# Altium footprint library Connectors.PcbLib: 268 footprints (part 11 of 21)
Each footprint in its own frame and in the unit in brackets; x right, y up, seen from the top. Pads: shape width x height; smd on the part's side, far side on the other; paste and mask are expansions set on the pad; w line width, h text height; cw(c..) or ccw(c..) is an arc to the next point about the centre after c.
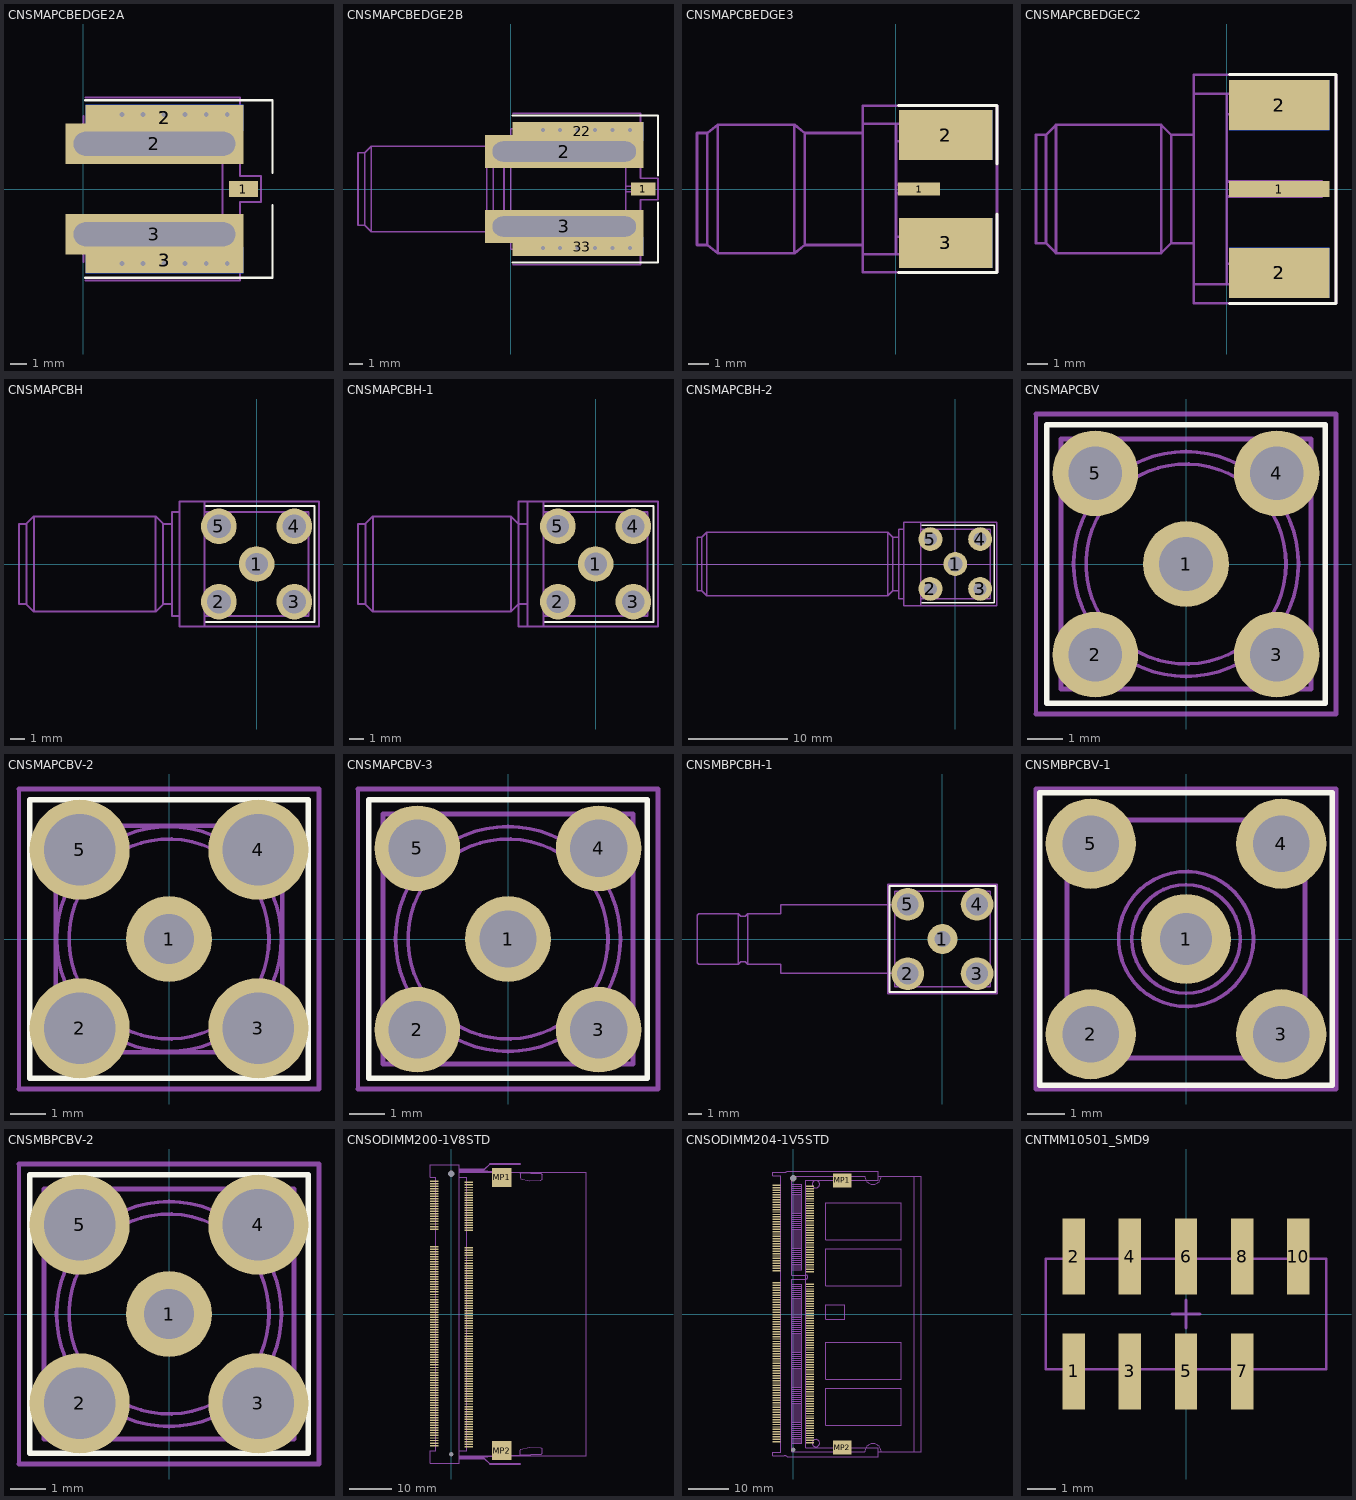
[diagram p10: the footprints below, top view; thin cyan lines are the x and y axes]

## CNSMAPCBEDGE2A [mm] "SMA PCB edge female 2 - pads only"
height 6
pads (7):
  rect 1.8x1 smd paste-3: 1(9.9,0)
  rect 11x2.5 hole 1.5 slot 10 at 0 deg mask+0.254: 2(4.4,2.8) 3(4.4,-2.8)
  rect 9.75x1.6 smd paste-3: 2(5.025,4.4) 3(5.025,-4.4)
  rect 9.75x1.6 smd far side paste-3: 2(5.025,4.4) 3(5.025,-4.4)
via 5,-4.6 diameter 0.65 hole 0.3
via 3.7,-4.6 diameter 0.65 hole 0.3
via 2.4,-4.6 diameter 0.65 hole 0.3
via 6.3,-4.6 diameter 0.65 hole 0.3
via 7.6,-4.6 diameter 0.65 hole 0.3
via 8.9,-4.6 diameter 0.65 hole 0.3
via 8.9,4.6 diameter 0.65 hole 0.3
via 7.6,4.6 diameter 0.65 hole 0.3
via 6.3,4.6 diameter 0.65 hole 0.3
via 2.4,4.6 diameter 0.65 hole 0.3
via 3.7,4.6 diameter 0.65 hole 0.3
via 5,4.6 diameter 0.65 hole 0.3
Top Overlay:
  lines w0.15: 0.131,-5.5 11.7,-5.5 11.7,-1 ; 0.131,5.5 11.7,5.5 11.7,1
Mechanical 15:
  lines w0.127: 0,-4.5 0,-2.8 8.6,-2.8 8.6,2.8 0,2.8 0,4.5 ; 0.15,-5.65 9.7,-5.65 9.7,-0.8 11,-0.8 11,0.8 9.7,0.8 9.7,5.65 0.15,5.65

## CNSMAPCBEDGE2B [mm] "SMA PCB edge female 2 reduced copper bot"
height 6
pads (7):
  rect 1.8x1 smd paste-5: 1(9.9,0)
  rect 11.8x2.5 hole 1.5 slot 10.7 at 0 deg mask+0.254: 2(4,2.8) 3(4,-2.8)
  rect 9.75x1.4 smd paste-10: 2(5.025,4.3) 3(5.025,-4.3)
  rect 8.5x1.4 smd far side paste-10: 2(5.65,4.3) 3(5.65,-4.3)
via 5,-4.4 diameter 0.65 hole 0.3
via 3.7,-4.4 diameter 0.65 hole 0.3
via 2.4,-4.4 diameter 0.65 hole 0.3
via 6.3,-4.4 diameter 0.65 hole 0.3
via 7.6,-4.4 diameter 0.65 hole 0.3
via 8.9,-4.4 diameter 0.65 hole 0.3
via 8.9,4.4 diameter 0.65 hole 0.3
via 7.6,4.4 diameter 0.65 hole 0.3
via 6.3,4.4 diameter 0.65 hole 0.3
via 2.4,4.4 diameter 0.65 hole 0.3
via 3.7,4.4 diameter 0.65 hole 0.3
via 5,4.4 diameter 0.65 hole 0.3
Top Overlay:
  lines w0.15: 0.131,-5.5 11,-5.5 11,-1 ; 0.131,5.5 11,5.5 11,1
Top Solder:
  rectangle: 0,1.5 8.6,5
  rectangle: 0,-5 8.6,-1.5
Bottom Solder:
  rectangle: 0,1.5 8.6,4.3
  rectangle: 0,-4.3 8.6,-1.5
Mechanical 13:
  lines w0.127: -1.8,-3.2 -10.4,-3.2 ; -1.8,3.2 -10.4,3.2 ; -1.3,-2.7 -0.5,-2.7 ; -1.3,2.7 -0.5,2.7 ; 0,-3.2 -0.5,-3.2 -0.5,3.2 0,3.2 ; 8.6,-0.203 10.6,-0.203 10.6,0.203 8.6,0.203 ; -10.9,-2.7 -11.4,-2.7 -11.4,2.7 -10.9,2.7 ; -10.9,-2.7 -10.4,-3.2 ; -10.9,-2.7 -10.9,2.7 ; -10.9,2.7 -10.4,3.2 ; -10.4,-3.2 -9.4,-3.2 ; -10.4,-3.2 -10.4,-3.1 -10.4,3.2 ; -9.4,-3.2 -9.4,-3.2 ; -1.794,3.2 -1.294,2.7 -1.294,-2.7 ; -1.794,3.2 -1.794,-3.2 -1.294,-2.7 ; -1.794,3.2 -1.794,3.2 ; -1.294,-2.7 -1.294,-2.7 ; 0,-3.5 0,-4.5 8.6,-4.5 8.6,-3.5 ; 0,-3.5 8.6,-3.5 ; 0,-3.5 0,3.5 ; 0,3.5 0,4.5 8.6,4.5 8.6,3.5 ; 0,3.5 8.6,3.5 ; 8.6,-3.5 8.6,3.5
Mechanical 15:
  lines w0.127: 0,-4.5 0,-2.8 8.6,-2.8 8.6,2.8 0,2.8 0,4.5 ; 0.15,-5.65 9.7,-5.65 9.7,-0.8 11,-0.8 11,0.8 9.7,0.8 9.7,5.65 0.15,5.65
  text "PCB MILLING LINE" at -4,1.7 h0.8
3D body "CN-SMAPCBHE1.stp": height 4.1, standoff -2.9, extent -11.4,-4.472 10.6,4.472

## CNSMAPCBEDGE3 [mm] "SMA PCB edge female EL-FS090-03"
height 6.3
pads (5):
  rect 2.032x0.61 smd: 1(1.118,0)
  rect 4.5x2.4 smd: 2(2.4,2.6) 3(2.4,-2.6)
  rect 4.5x2.4 smd far side: 2(2.4,2.6) 3(2.4,-2.6)
Top Overlay:
  lines w0.15: 0.131,-4.025 4.875,-4.025 4.875,-1.2 ; 0.131,4.025 4.875,4.025 4.875,1.2
Mechanical 13:
  lines w0.127: -1.6,-2.7 -4.4,-2.7 ; -1.6,2.7 -4.4,2.7 ; 0,-2.3 3.8,-2.3 3.8,-3.15 0,-3.15 ; 0,-0.203 1.854,-0.203 1.854,0.203 0,0.203 ; 0,2.3 3.8,2.3 3.8,3.15 0,3.15 ; -9.1,-2.7 -9.6,-2.7 -9.6,2.7 -9.1,2.7 ; -9.1,-2.7 -9.1,2.7 ; -9.1,-2.7 -8.6,-3.1 ; -9.1,2.7 -8.6,3.1 ; -8.6,-3.1 -4.9,-3.1 ; -8.6,-3.1 -8.6,3.1 ; -8.6,3.1 -4.9,3.1 ; -4.9,-3.1 -4.4,-2.7 ; -4.9,-3.1 -4.9,3.1 ; -4.9,3.1 -4.4,2.7 ; -4.4,-2.7 -4.4,-2.7 ; -4.4,-2.7 -4.4,2.7 ; 0,-3.15 0,3.15 ; 0,-3.15 -1.6,-3.15 -1.6,3.15 0,3.15
Mechanical 15:
  lines w0.127: -1.6,-4.025 4.875,-4.025 4.875,4.025 -1.6,4.025 -1.6,-4.025
3D body: height 0.77, standoff 0.02, extent 0,-0.374 2,0.374
3D body: height 1, standoff 0, extent 0,2.3 3.8,3.15
3D body: height -1.7, standoff -2.8, extent 0,2.3 3.8,3.15
3D body: height -1.7, standoff -2.8, extent 0,-3.15 3.8,-2.3
3D body: height 3.5, standoff -2.8, extent -1.6,-3.15 0,3.15
3D body: height 1, standoff 0, extent 0,-3.15 3.8,-2.3
3D body: height 3.08, standoff -2.3, extent -4.6,-2.695 -1.6,2.695
3D body: height 3.08, standoff -2.3, extent -9.6,-2.7 -8.7,2.689
3D body: height 3.48, standoff -2.7, extent -8.85,-3.094 -4.6,3.094

## CNSMAPCBEDGEC2 [mm] "SMA PCB edge female W9.54mm"
height 4.36
pads (5):
  rect 5x0.8 smd: 1(2.625,0)
  rect 5x2.5 smd: 2(2.625,-4.191) 2(2.625,4.191)
  rect 5x2.5 smd far side: 2(2.625,-4.191) 2(2.625,4.191)
Top Overlay:
  lines w0.15: 0.131,-5.715 5.461,-5.715 5.461,5.715 0.131,5.715
Mechanical 13:
  lines w0.127: -1.65,-2.7 -2.769,-2.7 ; -1.65,2.7 -2.769,2.7 ; 0,-3.734 4.75,-3.734 4.75,-4.75 0,-4.75 ; 0,-0.375 4.75,-0.375 4.75,0.375 0,0.375 ; 0,3.734 4.75,3.734 4.75,4.75 0,4.75 ; -9.025,-2.7 -9.525,-2.7 -9.525,2.7 -9.025,2.7 ; -9.025,-2.7 -8.525,-3.2 ; -9.025,-2.7 -9.025,2.7 ; -9.025,2.7 -8.525,3.2 ; -8.525,-3.2 -3.269,-3.2 ; -8.525,-3.2 -7.525,-3.2 ; -8.525,-3.2 -8.525,-3.1 -8.525,3.2 ; -8.525,3.2 -3.269,3.2 ; -7.525,-3.2 -7.525,-3.2 ; -3.269,-3.2 -2.769,-2.7 ; -3.269,-3.2 -3.269,3.2 ; -3.269,3.2 -2.769,2.7 ; -3.269,3.2 -3.269,3.2 ; -2.769,-2.7 -2.769,-2.7 ; -2.769,-2.7 -2.769,2.7 ; 0,-4.75 0,-3.5 0,3.5 0,4.75 ; 0,-4.75 -1.65,-4.75 -1.65,4.75 0,4.75
Mechanical 15:
  lines w0.127: -1.65,-5.715 5.461,-5.715 5.461,5.715 -1.65,5.715 -1.65,-5.715
3D body "732511150.stp": height 4.37, standoff -3.56, extent -9.53,-4.77 4.75,4.77

## CNSMAPCBH [mm]
height 10
pads (5):
  round 2.4 hole 1.5: 1(0,0)
  round 2.4 hole 1.6: 2(-2.54,-2.54) 3(2.54,-2.54) 4(2.54,2.54) 5(-2.54,2.54)
Top Overlay:
  lines w0.15: -3.4,-3.9 3.9,-3.9 3.9,3.9 -3.4,3.9
Mechanical 13:
  lines w0.127: -5.7,-2.7 -6.3,-2.7 ; -5.2,-3.5 -5.7,-3.5 -5.7,2.7 ; -5.2,3.5 -5.7,3.5 -5.7,2.7 ; -15.5,-2.7 -15.5,2.7 ; -15.5,-2.7 -15,-3.2 ; -15.5,-2.7 -16,-2.7 -16,2.7 -15.5,2.7 ; -15.5,2.7 -15,3.2 ; -15,-3.2 -15,-3.1 -15,3.2 ; -15,-3.2 -14,-3.2 ; -15,3.2 -6.8,3.2 ; -14,-3.2 -14,-3.2 ; -14,-3.2 -6.8,-3.2 ; -6.8,-3.2 -6.8,3.2 ; -6.8,-3.2 -6.3,-2.7 ; -6.8,3.2 -6.8,3.2 ; -6.8,3.2 -6.3,2.7 ; -6.3,-2.7 -6.3,2.7 ; -6.3,-2.7 -6.3,-2.7 ; -6.3,2.7 -5.7,2.7 ; -3.5,-3.5 -3.5,-4.2 -5.2,-4.2 -5.2,4.2 -3.5,4.2 -3.5,3.5 ; -3.5,-3.5 -3.5,3.5 ; -3.5,-3.5 3.5,-3.5 3.5,3.5 -3.5,3.5
Mechanical 15:
  lines w0.127: -5.2,-4.2 -5.2,4.2 4.2,4.2 4.2,-4.2 -5.2,-4.2

## CNSMAPCBH-1 [mm] "SMA connector PCB right angle for panel mount in THDW tech."
height 10.44
pads (5):
  round 2.4 hole 1.524: 1(0,0) 2(-2.54,-2.54) 3(2.54,-2.54) 4(2.54,2.54) 5(-2.54,2.54)
Top Overlay:
  lines w0.15: -3.4,-3.9 3.9,-3.9 3.9,3.9 -3.4,3.9
Mechanical 13:
  lines w0.127: -4.6,-2.7 -5.2,-2.7 ; -4.6,2.7 -5.2,2.7 ; -15.5,-2.7 -16,-2.7 -16,2.7 -15.5,2.7 ; -15.5,-2.7 -15,-3.2 ; -15.5,-2.7 -15.5,2.7 ; -15.5,2.7 -15,3.2 ; -15,-3.2 -14,-3.2 ; -15,-3.2 -15,-3.1 -15,3.2 ; -15,3.2 -5.7,3.2 ; -14,-3.2 -5.7,-3.2 ; -14,-3.2 -14,-3.2 ; -5.7,-3.2 -5.2,-2.7 ; -5.7,-3.2 -5.7,3.2 ; -5.7,3.2 -5.2,2.7 ; -5.7,3.2 -5.7,3.2 ; -5.2,-2.7 -5.2,-2.7 ; -5.2,-2.7 -5.2,2.7 ; -3.5,-3.5 -3.5,3.5 ; -3.5,-3.5 -3.5,-4.2 -4.6,-4.2 -4.6,4.2 -3.5,4.2 -3.5,3.5 ; -3.5,-3.5 3.5,-3.5 3.5,3.5 -3.5,3.5
Mechanical 15:
  lines w0.127: -5.2,-4.2 -5.2,4.2 4.2,4.2 4.2,-4.2 -5.2,-4.2
3D body: height 6.8, standoff 6, extent -16.053,-0.398 -15.553,0.399
3D body: height 8.6, standoff 4.2, extent -16.027,-2.191 -15.527,2.191
3D body: height 9.55, standoff 3.25, extent -15.2,-3.15 -5.5,3.15
3D body: height 9.08, standoff 3.7, extent -16,-2.695 -15.1,2.695
3D body: height 9.08, standoff 3.7, extent -5.5,-2.695 -4.6,2.695
3D body: height 10.65, standoff 2.15, extent -4.55,-4.249 -3.5,4.249
3D body: height 10.44, standoff 0, extent -3.5,-3.5 3.5,3.5

## CNSMAPCBH-2 [mm] "SMA connector PCB horizontal R5.0mm L=29.5mm"
height 10
pads (5):
  round 2.4 hole 1.5: 1(0,0)
  round 2.4 hole 1.3: 2(-2.5,-2.5) 3(2.5,-2.5) 4(2.5,2.5) 5(-2.5,2.5)
Top Overlay:
  lines w0.15: -3.4,-3.9 3.9,-3.9 3.9,3.9 -3.4,3.9
Mechanical 13:
  lines w0.127: -5.7,-2.7 -6.3,-2.7 ; -5.2,-3.5 -5.7,-3.5 -5.7,2.7 ; -5.2,3.5 -5.7,3.5 -5.7,2.7 ; -25.5,-2.7 -25.5,2.7 ; -25.5,-2.7 -25,-3.2 ; -25.5,-2.7 -26,-2.7 -26,2.7 -25.5,2.7 ; -25.5,2.7 -25,3.2 ; -25,-3.2 -25,-3.1 -25,3.2 ; -25,-3.2 -6.8,-3.2 ; -25,3.2 -6.8,3.2 ; -6.8,-3.2 -6.8,3.2 ; -6.8,-3.2 -6.3,-2.7 ; -6.8,3.2 -6.8,3.2 ; -6.8,3.2 -6.3,2.7 ; -6.3,-2.7 -6.3,2.7 ; -6.3,-2.7 -6.3,-2.7 ; -6.3,2.7 -5.7,2.7 ; -3.5,-3.5 -3.5,-4.2 -5.2,-4.2 -5.2,4.2 -3.5,4.2 -3.5,3.5 ; -3.5,-3.5 -3.5,3.5 ; -3.5,-3.5 3.5,-3.5 3.5,3.5 -3.5,3.5
Mechanical 15:
  lines w0.1: -26,-2.325 -26,1.975 ; -26,0 3.5,0 ; 0,-3.5 0,3.5
  lines w0.127: -5.2,-4.2 -5.2,4.2 4.2,4.2 4.2,-4.2 -5.2,-4.2
3D body: height 9.92, standoff 2.85, extent -5.7,-3.543 -5.2,3.543
3D body: height 10.62, standoff 2.15, extent -5.15,-4.242 -3.5,4.242
3D body: height 10, standoff 0, extent -3.4,-3.5 3.6,3.5
3D body: height 9.08, standoff 3.7, extent -6.6,-2.695 -5.7,2.695
3D body: height 9.08, standoff 3.7, extent -26,-2.695 -25.1,2.695
3D body: height 9.55, standoff 3.22, extent -25.1,-3.169 -6.6,3.169

## CNSMAPCBV [mm] "SMA connector PCB vertical R5.0mm"
height 10
pads (5):
  round 2.4 hole 1.5: 1(0,0) 2(-2.54,-2.54) 3(2.54,-2.54) 4(2.54,2.54) 5(-2.54,2.54)
Top Overlay:
  lines w0.15: -3.9,-3.9 3.9,-3.9 3.9,3.9 -3.9,3.9 -3.9,-3.9
Mechanical 13:
  circle w0.5: c0,0 r0.24
  circle w0.1: c0,0 r3.15
  circle w0.1: c0,0 r2.8
  lines w0.127: -3.5,-3.5 3.5,-3.5 3.5,3.5 -3.5,3.5 -3.5,-3.5
Mechanical 15:
  lines w0.1: -4.2,-4.2 -4.2,4.2
  lines w0.127: -4.2,-4.2 4.2,-4.2 4.2,4.2 -4.2,4.2
3D body "SMA-J-P-X-ST-TH1.step": height 9.57, standoff -3.94, extent -3.5,-3.5 3.5,3.501

## CNSMAPCBV-2 [mm] "SMA connector PCB vertical R5.0mm SMD PinInPaste"
height 7.6
pads (5):
  round 2.4 hole 1.4: 1(0,0)
  round 2.8 hole 2: 2(-2.5,-2.5) 3(2.5,-2.5) 4(2.5,2.5) 5(-2.5,2.5)
Top Overlay:
  lines w0.15: -3.9,-3.9 -3.9,3.9 3.9,3.9 3.9,-3.9 -3.9,-3.9
Mechanical 13:
  circle w0.1: c0,0 r2.8
  circle w0.1: c0,0 r3.15
  circle w0.5: c0,0 r0.24
  lines w0.127: -3.175,-3.175 -3.175,3.175 3.175,3.175 3.175,-3.175 -3.175,-3.175
Mechanical 15:
  lines w0.1: -4.2,-4.2 -4.2,4.2
  lines w0.127: -4.2,-4.2 4.2,-4.2 4.2,4.2 -4.2,4.2
3D body: height 1.03, standoff 0.1, extent -3.175,-3.175 3.175,3.175
3D body: height 1.03, standoff -1.27, extent -3.175,1.905 -1.905,3.175
3D body: height 1.03, standoff -1.27, extent -3.175,-3.175 -1.905,-1.905
3D body: height 1.03, standoff -1.27, extent 1.905,-3.175 3.175,-1.905
3D body: height 1.03, standoff -1.27, extent 1.905,1.905 3.175,3.175
3D body: height 7.6, standoff 3.38, extent -3.175,-3.175 3.15,3.162
3D body: height 4.41, standoff 1.03, extent -2.656,-2.667 2.656,2.656
3D body: height 7.6, standoff 3.38, extent -0.45,-0.45 0.446,0.448
3D body: height 7.6, standoff 3.38, extent -2.286,-2.286 2.268,2.277

## CNSMAPCBV-3 [mm] "SMA connector PCB vertical 7x7x9.5mm"
height 9.5
pads (5):
  round 2.4 hole 1.6: 1(0,0) 2(-2.54,-2.54) 3(2.54,-2.54) 4(2.54,2.54) 5(-2.54,2.54)
Top Overlay:
  lines w0.15: -3.9,-3.9 3.9,-3.9 3.9,3.9 -3.9,3.9 -3.9,-3.9
Mechanical 13:
  circle w0.5: c0,0 r0.24
  circle w0.1: c0,0 r3.15
  circle w0.1: c0,0 r2.8
  lines w0.127: -3.5,-3.5 3.5,-3.5 3.5,3.5 -3.5,3.5 -3.5,-3.5
Mechanical 15:
  lines w0.1: -4.2,-4.2 -4.2,4.2
  lines w0.127: -4.2,-4.2 4.2,-4.2 4.2,4.2 -4.2,4.2
3D body: height 0, standoff -4, extent -0.635,-0.635 0.635,0.635
3D body: height 9.51, standoff 9.5, extent -0.635,-0.635 0.635,0.635
3D body: height 0, standoff -4, extent -3.175,-3.048 -2.286,-2.159
3D body: height 0, standoff -4, extent 2.286,-3.048 3.175,-2.159
3D body: height 0, standoff -4, extent 2.286,2.159 3.175,3.048
3D body: height 0, standoff -4, extent -3.175,2.159 -2.286,3.048
3D body: height 9.5, standoff 1.9, extent -3.1,-3.1 3.1,3.1
3D body: height 1.7, standoff 0, extent -3.5,-3.5 3.5,3.5

## CNSMBPCBH-1 [mm] "SMB connector PCB horizontal R5.08mm THT"
height 7.5
pads (5):
  round 2.2 hole 1.2: 1(0,0)
  round 2.4 hole 1.6: 2(-2.54,-2.54) 3(2.54,-2.54) 4(2.54,2.54) 5(-2.54,2.54)
Top Overlay:
  lines w0.15: -3.9,-3.9 -3.9,3.9 3.9,3.9 3.9,-3.9 -3.9,-3.9
Mechanical 13:
  circle w0.5: c0,0 r0.14
  lines w0.1: -11.85,-1.85 -14.275,-1.85 ; -11.85,-1.843 -11.85,-2.501 ; -11.85,1.843 -11.85,2.499 ; -11.85,1.85 -14.275,1.85 ; -3.5,-2.501 -11.85,-2.501 ; -3.5,2.499 -11.85,2.499 ; -14.962,-1.85 -14.788,-1.675 -14.45,-1.675 -14.275,-1.85 ; -14.962,-1.85 -14.962,1.85 ; -14.962,-1.85 -17.875,-1.85 -18,-1.725 -18,1.725 -17.875,1.85 -14.962,1.85 ; -14.962,1.85 -14.788,1.675 -14.45,1.675 -14.275,1.85 ; -14.275,-1.85 -14.275,1.85 ; -11.85,-2.501 -11.85,-2.501 ; -11.85,2.499 -11.85,2.499
  lines w0.127: -3.5,-3.5 -3.5,3.5 3.5,3.5 3.5,-3.5 -3.5,-3.5
Mechanical 15:
  lines w0.127: -4,-4 4,-4 4,4 -4,4 -4,-4
3D body: height 8.2, standoff 3.2, extent -11.85,-2.501 -3.5,2.499
3D body: height 7.55, standoff 3.85, extent -14.275,-1.855 -11.85,1.843
3D body: height 0.51, standoff 0, extent 2.032,2.032 3.175,3.175
3D body: height 0.51, standoff 0, extent -3.175,2.032 -2.045,3.175
3D body: height 0.51, standoff 0, extent -3.175,-3.175 -2.032,-2.032
3D body: height 0.51, standoff 0, extent 2.032,-3.175 3.175,-2.032
3D body: height 8.7, standoff 0.51, extent -3.5,-3.5 3.5,3.5
3D body: height 0.1, standoff -3.5, extent -3.056,-3.056 -2.04,-2.04
3D body: height 0.1, standoff -3.5, extent 2.032,-3.056 3.048,-2.04
3D body: height 0.1, standoff -3.5, extent 2.04,2.04 3.056,3.056
3D body: height 0.1, standoff -3.5, extent -3.056,2.032 -2.04,3.048
3D body: height 7.2, standoff -3.9, extent -0.254,-0.254 0.252,0.253
3D body: height 7.37, standoff 4.03, extent -14.963,-1.68 -14.275,1.668
3D body: height 7.55, standoff 3.85, extent -18,-1.855 -14.963,1.843
3D body: height 7.1, standoff 4.3, extent -18.025,-1.404 -17.025,1.395

## CNSMBPCBV-1 [mm] "SMB connector PCB vertical R5.08mm THT"
height 7.5
pads (5):
  round 2.4 hole 1.4: 1(0,0)
  round 2.4 hole 1.5: 2(-2.54,-2.54) 3(2.54,-2.54) 4(2.54,2.54) 5(-2.54,2.54)
Top Overlay:
  lines w0.15: -3.9,-3.9 -3.9,3.9 3.9,3.9 3.9,-3.9 -3.9,-3.9
Mechanical 13:
  circle w0.1: c0,0 r1.8
  circle w0.1: c0,0 r1.45
  circle w0.5: c0,0 r0.14
  lines w0.127: -3.175,-3.175 -3.175,3.175 3.175,3.175 3.175,-3.175 -3.175,-3.175
Mechanical 15:
  lines w0.127: -4,-4 4,-4 4,4 -4,4 -4,-4
3D body: height 0.5, standoff 0, extent 2.032,2.032 3.175,3.175
3D body: height 0.5, standoff 0, extent -3.175,2.032 -2.045,3.175
3D body: height 0.5, standoff 0, extent -3.175,-3.175 -2.032,-2.032
3D body: height 0.5, standoff 0, extent 2.032,-3.175 3.175,-2.032
3D body: height 1.8, standoff 0.5, extent -3.175,-3.175 3.175,3.175
3D body: height 7.6, standoff 1.8, extent -1.575,-1.575 1.575,1.575
3D body: height 7.6, standoff 1.8, extent -1.829,-1.829 1.829,1.829
3D body: height 3.8, standoff 1.8, extent -1.417,-1.417 1.417,1.422
3D body: height 0.1, standoff -3.9, extent -3.056,-3.056 -2.04,-2.04
3D body: height 0.1, standoff -3.9, extent 2.032,-3.056 3.048,-2.04
3D body: height 0.1, standoff -3.9, extent 2.04,2.04 3.056,3.056
3D body: height 0.1, standoff -3.9, extent -3.056,2.032 -2.04,3.048
3D body: height 7.2, standoff -3.9, extent -0.254,-0.254 0.252,0.253

## CNSMBPCBV-2 [mm] "SMB connector PCB vertical R5.0mm THT"
height 7.6
pads (5):
  round 2.4 hole 1.4: 1(0,0)
  round 2.8 hole 2: 2(-2.5,-2.5) 3(2.5,-2.5) 4(2.5,2.5) 5(-2.5,2.5)
Top Overlay:
  lines w0.15: -3.9,-3.9 -3.9,3.9 3.9,3.9 3.9,-3.9 -3.9,-3.9
Mechanical 13:
  circle w0.1: c0,0 r2.8
  circle w0.1: c0,0 r3.15
  circle w0.5: c0,0 r0.24
  lines w0.127: -3.5,-3.5 -3.5,3.5 3.5,3.5 3.5,-3.5 -3.5,-3.5
Mechanical 15:
  lines w0.1: -4.2,-4.2 -4.2,4.2
  lines w0.127: -4.2,-4.2 4.2,-4.2 4.2,4.2 -4.2,4.2
3D body: height 0.5, standoff 0, extent 2.032,2.032 3.5,3.5
3D body: height 0.5, standoff 0, extent -3.5,2.032 -2.032,3.5
3D body: height 0.5, standoff 0, extent -3.5,-3.5 -2.032,-2.032
3D body: height 0.5, standoff 0, extent 2.032,-3.5 3.5,-2.032
3D body: height 1.8, standoff 0.5, extent -3.5,-3.5 3.5,3.5
3D body: height 7.6, standoff 1.8, extent -1.575,-1.575 1.575,1.575
3D body: height 7.6, standoff 1.8, extent -1.829,-1.829 1.829,1.829
3D body: height 3.8, standoff 1.8, extent -1.417,-1.417 1.417,1.422
3D body: height 0.1, standoff -3.9, extent -3.048,-3.048 -2.032,-2.032
3D body: height 0.1, standoff -3.9, extent 2.032,-3.048 3.048,-2.032
3D body: height 0.1, standoff -3.9, extent 2.032,2.032 3.048,3.048
3D body: height 0.1, standoff -3.9, extent -3.048,2.032 -2.032,3.048
3D body: height 7.2, standoff -3.9, extent -0.254,-0.254 0.252,0.253

## CNSODIMM200-1V8STD [mm] "Tyco 1473006-4"
height 5.2
pads (204):
  rect 2x0.35 smd: 1(-4.1,31.65) 2(4.1,31.35) 3(-4.1,31.05) 4(4.1,30.75) 5(-4.1,30.45) 6(4.1,30.15) 7(-4.1,29.85) 8(4.1,29.55) 9(-4.1,29.25) 10(4.1,28.95) 11(-4.1,28.65) 12(4.1,28.35) 13(-4.1,28.05) 14(4.1,27.75) 15(-4.1,27.45) 16(4.1,27.15) 17(-4.1,26.85) 18(4.1,26.55) 19(-4.1,26.25) 20(4.1,25.95) 21(-4.1,25.65) 22(4.1,25.35) 23(-4.1,25.05) 24(4.1,24.75) 25(-4.1,24.45) 26(4.1,24.15) 27(-4.1,23.85) 28(4.1,23.55) 29(-4.1,23.25) 30(4.1,22.95) 31(-4.1,22.65) 32(4.1,22.35) 33(-4.1,22.05) 34(4.1,21.75) 35(-4.1,21.45) 36(4.1,21.15) 37(-4.1,20.85) 38(4.1,20.55) 39(-4.1,20.25) 40(4.1,19.95) 41(-4.1,16.05) 42(4.1,15.75) 43(-4.1,15.45) 44(4.1,15.15) 45(-4.1,14.85) 46(4.1,14.55) 47(-4.1,14.25) 48(4.1,13.95) 49(-4.1,13.65) 50(4.1,13.35) 51(-4.1,13.05) 52(4.1,12.75) 53(-4.1,12.45) 54(4.1,12.15) 55(-4.1,11.85) 56(4.1,11.55) 57(-4.1,11.25) 58(4.1,10.95) 59(-4.1,10.65) 60(4.1,10.35) 61(-4.1,10.05) 62(4.1,9.75) 63(-4.1,9.45) 64(4.1,9.15) 65(-4.1,8.85) 66(4.1,8.55) 67(-4.1,8.25) 68(4.1,7.95) 69(-4.1,7.65) 70(4.1,7.35) 71(-4.1,7.05) 72(4.1,6.75) 73(-4.1,6.45) 74(4.1,6.15) 75(-4.1,5.85) 76(4.1,5.55) 77(-4.1,5.25) 78(4.1,4.95) 79(-4.1,4.65) 80(4.1,4.35) 81(-4.1,4.05) 82(4.1,3.75) 83(-4.1,3.45) 84(4.1,3.15) 85(-4.1,2.85) 86(4.1,2.55) 87(-4.1,2.25) 88(4.1,1.95) 89(-4.1,1.65) 90(4.1,1.35) 91(-4.1,1.05) 92(4.1,0.75) 93(-4.1,0.45) 94(4.1,0.15) 95(-4.1,-0.15) 96(4.1,-0.45) 97(-4.1,-0.75) 98(4.1,-1.05) 99(-4.1,-1.35) 100(4.1,-1.65) 101(-4.1,-1.95) 102(4.1,-2.25) 103(-4.1,-2.55) 104(4.1,-2.85) 105(-4.1,-3.15) 106(4.1,-3.45) 107(-4.1,-3.75) 108(4.1,-4.05) 109(-4.1,-4.35) 110(4.1,-4.65) 111(-4.1,-4.95) 112(4.1,-5.25) 113(-4.1,-5.55) 114(4.1,-5.85) 115(-4.1,-6.15) 116(4.1,-6.45) 117(-4.1,-6.75) 118(4.1,-7.05) 119(-4.1,-7.35) 120(4.1,-7.65) 121(-4.1,-7.95) 122(4.1,-8.25) 123(-4.1,-8.55) 124(4.1,-8.85) 125(-4.1,-9.15) 126(4.1,-9.45) 127(-4.1,-9.75) 128(4.1,-10.05) 129(-4.1,-10.35) 130(4.1,-10.65) 131(-4.1,-10.95) 132(4.1,-11.25) 133(-4.1,-11.55) 134(4.1,-11.85) 135(-4.1,-12.15) 136(4.1,-12.45) 137(-4.1,-12.75) 138(4.1,-13.05) 139(-4.1,-13.35) 140(4.1,-13.65) 141(-4.1,-13.95) 142(4.1,-14.25) 143(-4.1,-14.55) 144(4.1,-14.85) 145(-4.1,-15.15) 146(4.1,-15.45) 147(-4.1,-15.75) 148(4.1,-16.05) 149(-4.1,-16.35) 150(4.1,-16.65) 151(-4.1,-16.95) 152(4.1,-17.25) 153(-4.1,-17.55) 154(4.1,-17.85) 155(-4.1,-18.15) 156(4.1,-18.45) 157(-4.1,-18.75) 158(4.1,-19.05) 159(-4.1,-19.35) 160(4.1,-19.65) 161(-4.1,-19.95) 162(4.1,-20.25) 163(-4.1,-20.55) 164(4.1,-20.85) 165(-4.1,-21.15) 166(4.1,-21.45) 167(-4.1,-21.75) 168(4.1,-22.05) 169(-4.1,-22.35) 170(4.1,-22.65) 171(-4.1,-22.95) 172(4.1,-23.25) 173(-4.1,-23.55) 174(4.1,-23.85) 175(-4.1,-24.15) 176(4.1,-24.45) 177(-4.1,-24.75) 178(4.1,-25.05) 179(-4.1,-25.35) 180(4.1,-25.65) 181(-4.1,-25.95) 182(4.1,-26.25) 183(-4.1,-26.55) 184(4.1,-26.85) 185(-4.1,-27.15) 186(4.1,-27.45) 187(-4.1,-27.75) 188(4.1,-28.05) 189(-4.1,-28.35) 190(4.1,-28.65) 191(-4.1,-28.95) 192(4.1,-29.25) 193(-4.1,-29.55) 194(4.1,-29.85) 195(-4.1,-30.15) 196(4.1,-30.45) 197(-4.1,-30.75) 198(4.1,-31.05) 199(-4.1,-31.35) 200(4.1,-31.65)
  round 0 hole 1.6 unplated mask+1: MH1(0,33.4)
  round 0 hole 1.1 unplated mask+1: MH2(0,-33.4)
  rect 4.6x4.5 smd mask+0.95: MP1(12,32.55) MP2(12,-32.55)
Mechanical 13:
  lines w0.127: 1.85,-33.8 32.1,-33.8 32.1,33.8 1.85,33.8 ; 1.85,-32.55 3.7,-32.55 3.7,32.55 ; 16.422,-33.661 16.425,-32.5 16.575,-32.225 18.55,-31.7 21.35,-31.9 21.65,-32.15 21.65,-33.225 21.45,-33.425 ; 16.422,33.661 16.425,32.5 16.575,32.225 18.55,31.7 21.35,31.9 21.65,32.15 21.65,33.225 21.45,33.425 ; 3.7,32.55 1.85,32.55 3.7,32.55 ; -5,-35.55 -5,-32.55 -3.7,-32.55 -3.7,32.55 -5,32.55 -5,35.55 1.85,35.55 1.85,-35.55 -5,-35.55
  lines w0.4: 2,-34.425 7.875,-34.425 9.2,-35.75 16.4,-35.75 ; 2,-34.025 8.675,-34.025 21.45,-33.425 ; 2,34.025 8.675,34.025 21.45,33.425 ; 2,34.425 7.875,34.425 9.2,35.75 16.4,35.75

## CNSODIMM204-1V5STD [mm] "Foxconn"
height 5.2
pads (208):
  rrect50% 2x0.35 smd: 1(-4.1,31.65) 2(4.1,31.35) 3(-4.1,31.05) 4(4.1,30.75) 5(-4.1,30.45) 6(4.1,30.15) 7(-4.1,29.85) 8(4.1,29.55) 9(-4.1,29.25) 10(4.1,28.95) 11(-4.1,28.65) 12(4.1,28.35) 13(-4.1,28.05) 14(4.1,27.75) 15(-4.1,27.45) 16(4.1,27.15) 17(-4.1,26.85) 18(4.1,26.55) 19(-4.1,26.25) 20(4.1,25.95) 21(-4.1,25.65) 22(4.1,25.35) 23(-4.1,25.05) 24(4.1,24.75) 25(-4.1,24.45) 26(4.1,24.15) 27(-4.1,23.85) 28(4.1,23.55) 29(-4.1,23.25) 30(4.1,22.95) 31(-4.1,22.65) 32(4.1,22.35) 33(-4.1,22.05) 34(4.1,21.75) 35(-4.1,21.45) 36(4.1,21.15) 37(-4.1,20.85) 38(4.1,20.55) 39(-4.1,20.25) 40(4.1,19.95) 41(-4.1,19.65) 42(4.1,19.35) 43(-4.1,19.05) 44(4.1,18.75) 45(-4.1,18.45) 46(4.1,18.15) 47(-4.1,17.85) 48(4.1,17.55) 49(-4.1,17.25) 50(4.1,16.95) 51(-4.1,16.65) 52(4.1,16.35) 53(-4.1,16.05) 54(4.1,15.75) 55(-4.1,15.45) 56(4.1,15.15) 57(-4.1,14.85) 58(4.1,14.55) 59(-4.1,14.25) 60(4.1,13.95) 61(-4.1,13.65) 62(4.1,13.35) 63(-4.1,13.05) 64(4.1,12.75) 65(-4.1,12.45) 66(4.1,12.15) 67(-4.1,11.85) 68(4.1,11.55) 69(-4.1,11.25) 70(4.1,10.95) 71(-4.1,10.65) 72(4.1,10.35) 73(-4.1,7.65) 74(4.1,7.35) 75(-4.1,7.05) 76(4.1,6.75) 77(-4.1,6.45) 78(4.1,6.15) 79(-4.1,5.85) 80(4.1,5.55) 81(-4.1,5.25) 82(4.1,4.95) 83(-4.1,4.65) 84(4.1,4.35) 85(-4.1,4.05) 86(4.1,3.75) 87(-4.1,3.45) 88(4.1,3.15) 89(-4.1,2.85) 90(4.1,2.55) 91(-4.1,2.25) 92(4.1,1.95) 93(-4.1,1.65) 94(4.1,1.35) 95(-4.1,1.05) 96(4.1,0.75) 97(-4.1,0.45) 98(4.1,0.15) 99(-4.1,-0.15) 100(4.1,-0.45) 101(-4.1,-0.75) 102(4.1,-1.05) 103(-4.1,-1.35) 104(4.1,-1.65) 105(-4.1,-1.95) 106(4.1,-2.25) 107(-4.1,-2.55) 108(4.1,-2.85) 109(-4.1,-3.15) 110(4.1,-3.45) 111(-4.1,-3.75) 112(4.1,-4.05) 113(-4.1,-4.35) 114(4.1,-4.65) 115(-4.1,-4.95) 116(4.1,-5.25) 117(-4.1,-5.55) 118(4.1,-5.85) 119(-4.1,-6.15) 120(4.1,-6.45) 121(-4.1,-6.75) 122(4.1,-7.05) 123(-4.1,-7.35) 124(4.1,-7.65) 125(-4.1,-7.95) 126(4.1,-8.25) 127(-4.1,-8.55) 128(4.1,-8.85) 129(-4.1,-9.15) 130(4.1,-9.45) 131(-4.1,-9.75) 132(4.1,-10.05) 133(-4.1,-10.35) 134(4.1,-10.65) 135(-4.1,-10.95) 136(4.1,-11.25) 137(-4.1,-11.55) 138(4.1,-11.85) 139(-4.1,-12.15) 140(4.1,-12.45) 141(-4.1,-12.75) 142(4.1,-13.05) 143(-4.1,-13.35) 144(4.1,-13.65) 145(-4.1,-13.95) 146(4.1,-14.25) 147(-4.1,-14.55) 148(4.1,-14.85) 149(-4.1,-15.15) 150(4.1,-15.45) 151(-4.1,-15.75) 152(4.1,-16.05) 153(-4.1,-16.35) 154(4.1,-16.65) 155(-4.1,-16.95) 156(4.1,-17.25) 157(-4.1,-17.55) 158(4.1,-17.85) 159(-4.1,-18.15) 160(4.1,-18.45) 161(-4.1,-18.75) 162(4.1,-19.05) 163(-4.1,-19.35) 164(4.1,-19.65) 165(-4.1,-19.95) 166(4.1,-20.25) 167(-4.1,-20.55) 168(4.1,-20.85) 169(-4.1,-21.15) 170(4.1,-21.45) 171(-4.1,-21.75) 172(4.1,-22.05) 173(-4.1,-22.35) 174(4.1,-22.65) 175(-4.1,-22.95) 176(4.1,-23.25) 177(-4.1,-23.55) 178(4.1,-23.85) 179(-4.1,-24.15) 180(4.1,-24.45) 181(-4.1,-24.75) 182(4.1,-25.05) 183(-4.1,-25.35) 184(4.1,-25.65) 185(-4.1,-25.95) 186(4.1,-26.25) 187(-4.1,-26.55) 188(4.1,-26.85) 189(-4.1,-27.15) 190(4.1,-27.45) 191(-4.1,-27.75) 192(4.1,-28.05) 193(-4.1,-28.35) 194(4.1,-28.65) 195(-4.1,-28.95) 196(4.1,-29.25) 197(-4.1,-29.55) 198(4.1,-29.85) 199(-4.1,-30.15) 200(4.1,-30.45) 201(-4.1,-30.75) 202(4.1,-31.05) 203(-4.1,-31.35) 204(4.1,-31.65)
  round 0 hole 1.6 unplated mask+1: MH1(0,33.4)
  round 0 hole 1.1 unplated mask+1: MH2(0,-33.4)
  rect 4.6x3.5 smd: MP1(12,32.8) MP2(12,-32.8)
Mechanical 10:
  drawing of 168 lines, arcs and shapes, not listed
Mechanical 13:
  lines w0.127: 20.9,-33.8 31.5,-33.8 31.5,33.8 20.9,33.8 ; 20.9,35.05 20.9,32.8 13.5,32.8 13.5,31.65 10.5,31.65 10.5,32.8 3.1,32.8 3.1,-32.8 10.5,-32.8 10.5,-31.65 13.5,-31.65 13.5,-32.8 20.9,-32.8 20.9,-35.1 -1.45,-35.1 ccw(c-2.174,-35.824) -2.174,-34.8 -5,-34.8 -5,-34 -3.1,-34 -3.1,34 -5,34 -5,34.8 -2.174,34.8 ccw(c-2.174,35.824) -1.45,35.1 20.9,35.1
Mechanical 15:
  text "Component height under module max is 1.3mm" at 24.8,31.8 h1.52
3D body "AS0A62x-N2SN-7H-3D.stp": height 5.03, standoff -0.82, extent -5.025,-35.1 20.875,35.1
3D body: height 5.13, standoff 3.78, extent 7.935,-1.3 12.635,2.3
3D body: height 5.13, standoff 3.78, extent 7.935,-27.3 26.535,-18.3
3D body: height 2.68, standoff 1.33, extent 7.935,-27.3 26.535,-18.3
3D body: height 5.13, standoff 3.78, extent 7.935,-16 26.535,-7
3D body: height 2.68, standoff 1.33, extent 7.935,-16 26.535,-7
3D body: height 5.13, standoff 3.78, extent 7.935,7 26.535,16
3D body: height 2.68, standoff 1.33, extent 7.935,7 26.535,16
3D body: height 2.68, standoff 1.33, extent 7.935,18.3 26.535,27.3
3D body: height 5.13, standoff 3.78, extent 7.935,18.3 26.535,27.3
3D body: height 2.68, standoff 2.67, extent -0.415,-31.35 2.135,-31.021
3D body: height 3.79, standoff 3.78, extent -0.415,-31.35 2.135,-31.021
3D body: height 2.68, standoff 2.67, extent -0.415,-30.868 2.135,-30.538
3D body: height 3.79, standoff 3.78, extent -0.415,-30.868 2.135,-30.538
3D body: height 2.68, standoff 2.67, extent -0.415,-30.411 2.135,-30.081
3D body: height 3.79, standoff 3.78, extent -0.415,-30.411 2.135,-30.081
3D body: height 2.68, standoff 2.67, extent -0.415,-29.928 2.135,-29.599
3D body: height 3.79, standoff 3.78, extent -0.415,-29.928 2.135,-29.599
3D body: height 2.68, standoff 2.67, extent -0.415,-29.445 2.135,-29.116
3D body: height 3.79, standoff 3.78, extent -0.415,-29.445 2.135,-29.116
3D body: height 2.68, standoff 2.67, extent -0.415,-28.988 2.135,-28.659
3D body: height 3.79, standoff 3.78, extent -0.415,-28.988 2.135,-28.659
3D body: height 2.68, standoff 2.67, extent -0.415,-28.506 2.135,-28.176
3D body: height 3.79, standoff 3.78, extent -0.415,-28.506 2.135,-28.176
3D body: height 2.68, standoff 2.67, extent -0.415,-27.998 2.135,-27.668
3D body: height 3.79, standoff 3.78, extent -0.415,-27.998 2.135,-27.668
3D body: height 2.68, standoff 2.67, extent -0.415,-27.54 2.135,-27.211
3D body: height 3.79, standoff 3.78, extent -0.415,-27.54 2.135,-27.211
3D body: height 2.68, standoff 2.67, extent -0.415,-27.058 2.135,-26.728
3D body: height 3.79, standoff 3.78, extent -0.415,-27.058 2.135,-26.728
3D body: height 2.68, standoff 2.67, extent -0.415,-26.575 2.135,-26.246
3D body: height 3.79, standoff 3.78, extent -0.415,-26.575 2.135,-26.246
3D body: height 2.68, standoff 2.67, extent -0.415,-26.093 2.135,-25.763
3D body: height 3.79, standoff 3.78, extent -0.415,-26.093 2.135,-25.763
3D body: height 2.68, standoff 2.67, extent -0.415,-25.635 2.135,-25.306
3D body: height 3.79, standoff 3.78, extent -0.415,-25.635 2.135,-25.306
3D body: height 2.68, standoff 2.67, extent -0.415,-25.153 2.135,-24.823
3D body: height 3.79, standoff 3.78, extent -0.415,-25.153 2.135,-24.823
3D body: height 2.68, standoff 2.67, extent -0.415,-24.67 2.135,-24.341
3D body: height 3.79, standoff 3.78, extent -0.415,-24.67 2.135,-24.341
3D body: height 2.68, standoff 2.67, extent -0.415,-24.188 2.135,-23.858
3D body: height 3.79, standoff 3.78, extent -0.415,-24.188 2.135,-23.858
3D body: height 2.68, standoff 2.67, extent -0.415,-23.705 2.135,-23.376
3D body: height 3.79, standoff 3.78, extent -0.415,-23.705 2.135,-23.376
3D body: height 2.68, standoff 2.67, extent -0.415,-23.222 2.135,-22.893
3D body: height 3.79, standoff 3.78, extent -0.415,-23.222 2.135,-22.893
3D body: height 2.68, standoff 2.67, extent -0.415,-22.74 2.135,-22.41
3D body: height 3.79, standoff 3.78, extent -0.415,-22.74 2.135,-22.41
3D body: height 2.68, standoff 2.67, extent -0.415,-22.283 2.135,-21.953
3D body: height 3.79, standoff 3.78, extent -0.415,-22.283 2.135,-21.953
3D body: height 2.68, standoff 2.67, extent -0.415,-21.8 2.135,-21.471
3D body: height 3.79, standoff 3.78, extent -0.415,-21.8 2.135,-21.471
3D body: height 2.68, standoff 2.67, extent -0.415,-21.317 2.135,-20.988
3D body: height 3.79, standoff 3.78, extent -0.415,-21.317 2.135,-20.988
3D body: height 2.68, standoff 2.67, extent -0.415,-20.86 2.135,-20.531
3D body: height 3.79, standoff 3.78, extent -0.415,-20.86 2.135,-20.531
3D body: height 2.68, standoff 2.67, extent -0.415,-20.378 2.135,-20.048
3D body: height 3.79, standoff 3.78, extent -0.415,-20.378 2.135,-20.048
3D body: height 2.68, standoff 2.67, extent -0.415,-19.895 2.135,-19.566
3D body: height 3.79, standoff 3.78, extent -0.415,-19.895 2.135,-19.566
3D body: height 2.68, standoff 2.67, extent -0.415,-19.412 2.135,-19.083
3D body: height 3.79, standoff 3.78, extent -0.415,-19.412 2.135,-19.083
3D body: height 2.68, standoff 2.67, extent -0.415,-18.93 2.135,-18.6
3D body: height 3.79, standoff 3.78, extent -0.415,-18.93 2.135,-18.6
3D body: height 2.68, standoff 2.67, extent -0.415,-18.447 2.135,-18.118
3D body: height 3.79, standoff 3.78, extent -0.415,-18.447 2.135,-18.118
3D body: height 2.68, standoff 2.67, extent -0.415,-17.965 2.135,-17.635
3D body: height 3.79, standoff 3.78, extent -0.415,-17.965 2.135,-17.635
3D body: height 2.68, standoff 2.67, extent -0.415,-17.507 2.135,-17.178
3D body: height 3.79, standoff 3.78, extent -0.415,-17.507 2.135,-17.178
3D body: height 2.68, standoff 2.67, extent -0.415,-17.025 2.135,-16.695
3D body: height 3.79, standoff 3.78, extent -0.415,-17.025 2.135,-16.695
3D body: height 2.68, standoff 2.67, extent -0.415,-16.542 2.135,-16.213
3D body: height 3.79, standoff 3.78, extent -0.415,-16.542 2.135,-16.213
3D body: height 2.68, standoff 2.67, extent -0.415,-16.085 2.135,-15.756
3D body: height 3.79, standoff 3.78, extent -0.415,-16.085 2.135,-15.756
3D body: height 2.68, standoff 2.67, extent -0.415,-15.602 2.135,-15.273
3D body: height 3.79, standoff 3.78, extent -0.415,-15.602 2.135,-15.273
3D body: height 2.68, standoff 2.67, extent -0.415,-15.094 2.135,-14.765
3D body: height 3.79, standoff 3.78, extent -0.415,-15.094 2.135,-14.765
3D body: height 2.68, standoff 2.67, extent -0.415,-14.637 2.135,-14.308
3D body: height 3.79, standoff 3.78, extent -0.415,-14.637 2.135,-14.308
3D body: height 2.68, standoff 2.67, extent -0.415,-14.155 2.135,-13.825
3D body: height 3.79, standoff 3.78, extent -0.415,-14.155 2.135,-13.825
3D body: height 2.68, standoff 2.67, extent -0.415,-13.672 2.135,-13.343
3D body: height 3.79, standoff 3.78, extent -0.415,-13.672 2.135,-13.343
3D body: height 2.68, standoff 2.67, extent -0.415,-13.215 2.135,-12.885
3D body: height 3.79, standoff 3.78, extent -0.415,-13.215 2.135,-12.885
3D body: height 2.68, standoff 2.67, extent -0.415,-12.732 2.135,-12.403
3D body: height 3.79, standoff 3.78, extent -0.415,-12.732 2.135,-12.403
3D body: height 2.68, standoff 2.67, extent -0.415,-12.25 2.135,-11.92
3D body: height 3.79, standoff 3.78, extent -0.415,-12.25 2.135,-11.92
3D body: height 2.68, standoff 2.67, extent -0.415,-11.767 2.135,-11.438
3D body: height 3.79, standoff 3.78, extent -0.415,-11.767 2.135,-11.438
3D body: height 2.68, standoff 2.67, extent -0.415,-11.31 2.135,-10.98
3D body: height 3.79, standoff 3.78, extent -0.415,-11.31 2.135,-10.98
3D body: height 2.68, standoff 2.67, extent -0.415,-10.827 2.135,-10.498
3D body: height 3.79, standoff 3.78, extent -0.415,-10.827 2.135,-10.498
3D body: height 2.68, standoff 2.67, extent -0.415,-10.319 2.135,-9.99
3D body: height 3.79, standoff 3.78, extent -0.415,-10.319 2.135,-9.99
3D body: height 2.68, standoff 2.67, extent -0.415,-9.862 2.135,-9.533
3D body: height 3.79, standoff 3.78, extent -0.415,-9.862 2.135,-9.533
3D body: height 2.68, standoff 2.67, extent -0.415,-9.379 2.135,-9.05
3D body: height 3.79, standoff 3.78, extent -0.415,-9.379 2.135,-9.05
3D body: height 2.68, standoff 2.67, extent -0.415,-8.897 2.135,-8.567
3D body: height 3.79, standoff 3.78, extent -0.415,-8.897 2.135,-8.567
3D body: height 2.68, standoff 2.67, extent -0.415,-8.44 2.135,-8.11
3D body: height 3.79, standoff 3.78, extent -0.415,-8.44 2.135,-8.11
3D body: height 2.68, standoff 2.67, extent -0.415,-7.957 2.135,-7.628
3D body: height 3.79, standoff 3.78, extent -0.415,-7.957 2.135,-7.628
3D body: height 2.68, standoff 2.67, extent -0.415,-7.474 2.135,-7.145
3D body: height 3.79, standoff 3.78, extent -0.415,-7.474 2.135,-7.145
3D body: height 2.68, standoff 2.67, extent -0.415,-6.992 2.135,-6.662
3D body: height 3.79, standoff 3.78, extent -0.415,-6.992 2.135,-6.662
3D body: height 2.68, standoff 2.67, extent -0.415,-6.509 2.135,-6.18
3D body: height 3.79, standoff 3.78, extent -0.415,-6.509 2.135,-6.18
3D body: height 2.68, standoff 2.67, extent -0.415,-6.027 2.135,-5.697
3D body: height 3.79, standoff 3.78, extent -0.415,-6.027 2.135,-5.697
3D body: height 2.68, standoff 2.67, extent -0.415,-5.544 2.135,-5.215
3D body: height 3.79, standoff 3.78, extent -0.415,-5.544 2.135,-5.215
3D body: height 2.68, standoff 2.67, extent -0.415,-5.061 2.135,-4.732
3D body: height 3.79, standoff 3.78, extent -0.415,-5.061 2.135,-4.732
3D body: height 2.68, standoff 2.67, extent -0.415,-4.604 2.135,-4.275
3D body: height 3.79, standoff 3.78, extent -0.415,-4.604 2.135,-4.275
3D body: height 2.68, standoff 2.67, extent -0.415,-4.122 2.135,-3.792
3D body: height 3.79, standoff 3.78, extent -0.415,-4.122 2.135,-3.792
3D body: height 2.68, standoff 2.67, extent -0.415,-3.664 2.135,-3.335
3D body: height 3.79, standoff 3.78, extent -0.415,-3.664 2.135,-3.335
3D body: height 2.68, standoff 2.67, extent -0.415,-3.182 2.135,-2.852
3D body: height 3.79, standoff 3.78, extent -0.415,-3.182 2.135,-2.852
3D body: height 2.68, standoff 2.67, extent -0.415,-2.699 2.135,-2.37
3D body: height 3.79, standoff 3.78, extent -0.415,-2.699 2.135,-2.37
3D body: height 2.68, standoff 2.67, extent -0.415,-2.217 2.135,-1.887
3D body: height 3.79, standoff 3.78, extent -0.415,-2.217 2.135,-1.887
3D body: height 2.68, standoff 2.67, extent -0.415,-1.734 2.135,-1.405
3D body: height 3.79, standoff 3.78, extent -0.415,-1.734 2.135,-1.405
3D body: height 2.68, standoff 2.67, extent -0.415,-1.251 2.135,-0.922
3D body: height 3.79, standoff 3.78, extent -0.415,-1.251 2.135,-0.922
3D body: height 2.68, standoff 2.67, extent -0.415,-0.769 2.135,-0.439
3D body: height 3.79, standoff 3.78, extent -0.415,-0.769 2.135,-0.439
3D body: height 2.68, standoff 2.67, extent -0.415,-0.312 2.135,0.018
3D body: height 3.79, standoff 3.78, extent -0.415,-0.312 2.135,0.018
3D body: height 2.68, standoff 2.67, extent -0.415,0.171 2.135,0.5
3D body: height 3.79, standoff 3.78, extent -0.415,0.171 2.135,0.5
3D body: height 2.68, standoff 2.67, extent -0.415,0.654 2.135,0.983
3D body: height 3.79, standoff 3.78, extent -0.415,0.654 2.135,0.983
3D body: height 2.68, standoff 2.67, extent -0.415,1.111 2.135,1.44
3D body: height 3.79, standoff 3.78, extent -0.415,1.111 2.135,1.44
3D body: height 2.68, standoff 2.67, extent -0.415,1.593 2.135,1.923
3D body: height 3.79, standoff 3.78, extent -0.415,1.593 2.135,1.923
3D body: height 2.68, standoff 2.67, extent -0.415,2.076 2.135,2.405
3D body: height 3.79, standoff 3.78, extent -0.415,2.076 2.135,2.405
3D body: height 2.68, standoff 2.67, extent -0.415,2.584 2.135,2.913
3D body: height 3.79, standoff 3.78, extent -0.415,2.584 2.135,2.913
3D body: height 2.68, standoff 2.67, extent -0.415,3.041 2.135,3.371
3D body: height 3.79, standoff 3.78, extent -0.415,3.041 2.135,3.371
3D body: height 2.68, standoff 2.67, extent -0.415,3.524 2.135,3.853
3D body: height 3.79, standoff 3.78, extent -0.415,3.524 2.135,3.853
3D body: height 2.68, standoff 2.67, extent -0.415,4.006 2.135,4.336
3D body: height 3.79, standoff 3.78, extent -0.415,4.006 2.135,4.336
3D body: height 2.68, standoff 2.67, extent -0.415,4.464 2.135,4.793
3D body: height 3.79, standoff 3.78, extent -0.415,4.464 2.135,4.793
3D body: height 2.68, standoff 2.67, extent -0.415,4.946 2.135,5.276
3D body: height 3.79, standoff 3.78, extent -0.415,4.946 2.135,5.276
3D body: height 2.68, standoff 2.67, extent -0.415,5.429 2.135,5.758
3D body: height 3.79, standoff 3.78, extent -0.415,5.429 2.135,5.758
3D body: height 2.68, standoff 2.67, extent -0.415,5.886 2.135,6.215
3D body: height 3.79, standoff 3.78, extent -0.415,5.886 2.135,6.215
3D body: height 2.68, standoff 2.67, extent -0.415,6.394 2.135,6.723
3D body: height 3.79, standoff 3.78, extent -0.415,6.394 2.135,6.723
3D body: height 2.68, standoff 2.67, extent -0.415,6.877 2.135,7.206
3D body: height 3.79, standoff 3.78, extent -0.415,6.877 2.135,7.206
3D body: height 2.68, standoff 2.67, extent -0.415,10.912 2.135,11.241
3D body: height 3.79, standoff 3.78, extent -0.415,10.912 2.135,11.241
3D body: height 2.68, standoff 2.67, extent -0.415,11.387 2.135,11.716
3D body: height 3.79, standoff 3.78, extent -0.415,11.387 2.135,11.716
3D body: height 2.68, standoff 2.67, extent -0.415,11.869 2.135,12.199
3D body: height 3.79, standoff 3.78, extent -0.415,11.869 2.135,12.199
3D body: height 2.68, standoff 2.67, extent -0.415,12.352 2.135,12.681
3D body: height 3.79, standoff 3.78, extent -0.415,12.352 2.135,12.681
3D body: height 2.68, standoff 2.67, extent -0.415,12.835 2.135,13.164
3D body: height 3.79, standoff 3.78, extent -0.415,12.835 2.135,13.164
3D body: height 2.68, standoff 2.67, extent -0.415,13.317 2.135,13.647
3D body: height 3.79, standoff 3.78, extent -0.415,13.317 2.135,13.647
3D body: height 2.68, standoff 2.67, extent -0.415,13.79 2.135,14.119
3D body: height 3.79, standoff 3.78, extent -0.415,13.79 2.135,14.119
3D body: height 2.68, standoff 2.67, extent -0.415,14.265 2.135,14.594
3D body: height 3.79, standoff 3.78, extent -0.415,14.265 2.135,14.594
3D body: height 2.68, standoff 2.67, extent -0.415,14.74 2.135,15.069
3D body: height 3.79, standoff 3.78, extent -0.415,14.74 2.135,15.069
3D body: height 2.68, standoff 2.67, extent -0.415,15.22 2.135,15.549
3D body: height 3.79, standoff 3.78, extent -0.415,15.22 2.135,15.549
3D body: height 2.68, standoff 2.67, extent -0.415,15.695 2.135,16.024
3D body: height 3.79, standoff 3.78, extent -0.415,15.695 2.135,16.024
3D body: height 2.68, standoff 2.67, extent -0.415,16.17 2.135,16.499
3D body: height 3.79, standoff 3.78, extent -0.415,16.17 2.135,16.499
3D body: height 2.68, standoff 2.67, extent -0.415,16.645 2.135,16.974
3D body: height 3.79, standoff 3.78, extent -0.415,16.645 2.135,16.974
3D body: height 2.68, standoff 2.67, extent -0.415,17.127 2.135,17.457
3D body: height 3.79, standoff 3.78, extent -0.415,17.127 2.135,17.457
3D body: height 2.68, standoff 2.67, extent -0.415,17.61 2.135,17.939
3D body: height 3.79, standoff 3.78, extent -0.415,17.61 2.135,17.939
3D body: height 2.68, standoff 2.67, extent -0.415,18.092 2.135,18.422
3D body: height 3.79, standoff 3.78, extent -0.415,18.092 2.135,18.422
3D body: height 2.68, standoff 2.67, extent -0.415,18.565 2.135,18.894
3D body: height 3.79, standoff 3.78, extent -0.415,18.565 2.135,18.894
3D body: height 2.68, standoff 2.67, extent -0.415,19.04 2.135,19.369
3D body: height 3.79, standoff 3.78, extent -0.415,19.04 2.135,19.369
3D body: height 2.68, standoff 2.67, extent -0.415,19.515 2.135,19.844
3D body: height 3.79, standoff 3.78, extent -0.415,19.515 2.135,19.844
3D body: height 2.68, standoff 2.67, extent -0.415,19.997 2.135,20.327
3D body: height 3.79, standoff 3.78, extent -0.415,19.997 2.135,20.327
3D body: height 2.68, standoff 2.67, extent -0.415,20.462 2.135,20.792
3D body: height 3.79, standoff 3.78, extent -0.415,20.462 2.135,20.792
3D body: height 2.68, standoff 2.67, extent -0.415,20.937 2.135,21.267
3D body: height 3.79, standoff 3.78, extent -0.415,20.937 2.135,21.267
3D body: height 2.68, standoff 2.67, extent -0.415,21.42 2.135,21.749
3D body: height 3.79, standoff 3.78, extent -0.415,21.42 2.135,21.749
3D body: height 2.68, standoff 2.67, extent -0.415,21.902 2.135,22.232
3D body: height 3.79, standoff 3.78, extent -0.415,21.902 2.135,22.232
3D body: height 2.68, standoff 2.67, extent -0.415,22.4 2.135,22.73
3D body: height 3.79, standoff 3.78, extent -0.415,22.4 2.135,22.73
3D body: height 2.68, standoff 2.67, extent -0.415,22.875 2.135,23.205
3D body: height 3.79, standoff 3.78, extent -0.415,22.875 2.135,23.205
3D body: height 2.68, standoff 2.67, extent -0.415,23.35 2.135,23.68
3D body: height 3.79, standoff 3.78, extent -0.415,23.35 2.135,23.68
3D body: height 2.68, standoff 2.67, extent -0.415,23.823 2.135,24.152
3D body: height 3.79, standoff 3.78, extent -0.415,23.823 2.135,24.152
3D body: height 2.68, standoff 2.67, extent -0.415,24.298 2.135,24.627
3D body: height 3.79, standoff 3.78, extent -0.415,24.298 2.135,24.627
3D body: height 2.68, standoff 2.67, extent -0.415,24.773 2.135,25.102
3D body: height 3.79, standoff 3.78, extent -0.415,24.773 2.135,25.102
3D body: height 2.68, standoff 2.67, extent -0.415,25.255 2.135,25.585
3D body: height 3.79, standoff 3.78, extent -0.415,25.255 2.135,25.585
3D body: height 2.68, standoff 2.67, extent -0.415,25.712 2.135,26.042
3D body: height 3.79, standoff 3.78, extent -0.415,25.712 2.135,26.042
3D body: height 2.68, standoff 2.67, extent -0.415,26.225 2.135,26.555
3D body: height 3.79, standoff 3.78, extent -0.415,26.225 2.135,26.555
3D body: height 2.68, standoff 2.67, extent -0.415,26.7 2.135,27.03
3D body: height 3.79, standoff 3.78, extent -0.415,26.7 2.135,27.03
3D body: height 2.68, standoff 2.67, extent -0.415,27.175 2.135,27.505
3D body: height 3.79, standoff 3.78, extent -0.415,27.175 2.135,27.505
3D body: height 2.68, standoff 2.67, extent -0.415,27.65 2.135,27.98
3D body: height 3.79, standoff 3.78, extent -0.415,27.65 2.135,27.98
3D body: height 2.68, standoff 2.67, extent -0.415,28.125 2.135,28.455
3D body: height 3.79, standoff 3.78, extent -0.415,28.125 2.135,28.455
3D body: height 2.68, standoff 2.67, extent -0.415,29.546 2.135,29.875
3D body: height 3.79, standoff 3.78, extent -0.415,29.546 2.135,29.875
3D body: height 3.79, standoff 3.78, extent -0.415,29.071 2.135,29.4
3D body: height 2.68, standoff 2.67, extent -0.415,29.071 2.135,29.4
3D body: height 3.79, standoff 3.78, extent -0.415,28.596 2.135,28.925
3D body: height 2.68, standoff 2.67, extent -0.415,28.596 2.135,28.925
3D body: height 2.68, standoff 2.67, extent -0.415,30.021 2.135,30.35
3D body: height 3.79, standoff 3.78, extent -0.415,30.021 2.135,30.35
3D body: height 2.68, standoff 2.67, extent -0.415,30.521 2.135,30.85
3D body: height 3.79, standoff 3.78, extent -0.415,30.521 2.135,30.85
3D body: height 2.68, standoff 2.67, extent -0.415,30.996 2.135,31.325
3D body: height 3.79, standoff 3.78, extent -0.415,30.996 2.135,31.325
3D body: height 3.79, standoff 3.78, extent -0.415,31.471 2.135,31.8
3D body: height 2.68, standoff 2.67, extent -0.415,31.471 2.135,31.8
3D body: height 3.78, standoff 2.68, extent -0.415,-33.875 29.735,33.875

## CNTMM10501_SMD9 [mm] "Connector TMM Terminal strip, SMD 9pin"
height 6
pads (9):
  rect 0.8x2.7 smd: 1(-4,-2.05) 2(-4,2.05) 3(-2,-2.05) 4(-2,2.05) 5(0,-2.05) 6(0,2.05) 7(2,-2.05) 8(2,2.05) 10(4,2.05)
Mechanical 13:
  lines w0.102: -5,-1.97 -5,1.97 5,1.97 5,-1.97 -5,-1.97
Mechanical 15:
  lines w0.102: -0.5,0 0.5,0 ; 0,-0.5 0,0.5
3D body: height 2.77, standoff 1.27, extent -5.004,-1.981 5.029,1.981
3D body: height 6, standoff 0, extent -0.25,0.775 0.25,1.275
3D body: height 6, standoff 0, extent -0.25,-1.275 0.25,-0.775
3D body: height 6, standoff 0, extent -2.25,-1.275 -1.75,-0.775
3D body: height 6, standoff 0, extent -4.25,-1.275 -3.75,-0.775
3D body: height 6, standoff 0, extent 1.75,-1.275 2.25,-0.775
3D body: height 6, standoff 0, extent 3.75,0.775 4.25,1.275
3D body: height 6, standoff 0, extent 1.75,0.775 2.25,1.275
3D body: height 6, standoff 0, extent -2.25,0.775 -1.75,1.275
3D body: height 6, standoff 0, extent -4.25,0.775 -3.75,1.275
3D body: height 0.51, standoff 0, extent -4.25,0.775 -3.75,3.325
3D body: height 0.51, standoff 0, extent -2.25,0.775 -1.75,3.325
3D body: height 0.51, standoff 0, extent -0.25,0.775 0.25,3.325
3D body: height 0.51, standoff 0, extent 1.75,0.775 2.25,3.325
3D body: height 0.51, standoff 0, extent 3.75,0.775 4.25,3.325
3D body: height 0.51, standoff 0, extent 1.75,-3.325 2.25,-0.775
3D body: height 0.51, standoff 0, extent -0.25,-3.325 0.25,-0.775
3D body: height 0.51, standoff 0, extent -2.25,-3.325 -1.75,-0.775
3D body: height 0.51, standoff 0, extent -4.25,-3.325 -3.75,-0.775